# Altium footprint library controller_V1.3.1.PcbLib: 69 footprints (part 1 of 5)
Each footprint in its own frame and in the unit in brackets; x right, y up, seen from the top. Pads: shape width x height; smd on the part's side, far side on the other; paste and mask are expansions set on the pad; w line width, h text height; cw(c..) or ccw(c..) is an arc to the next point about the centre after c.
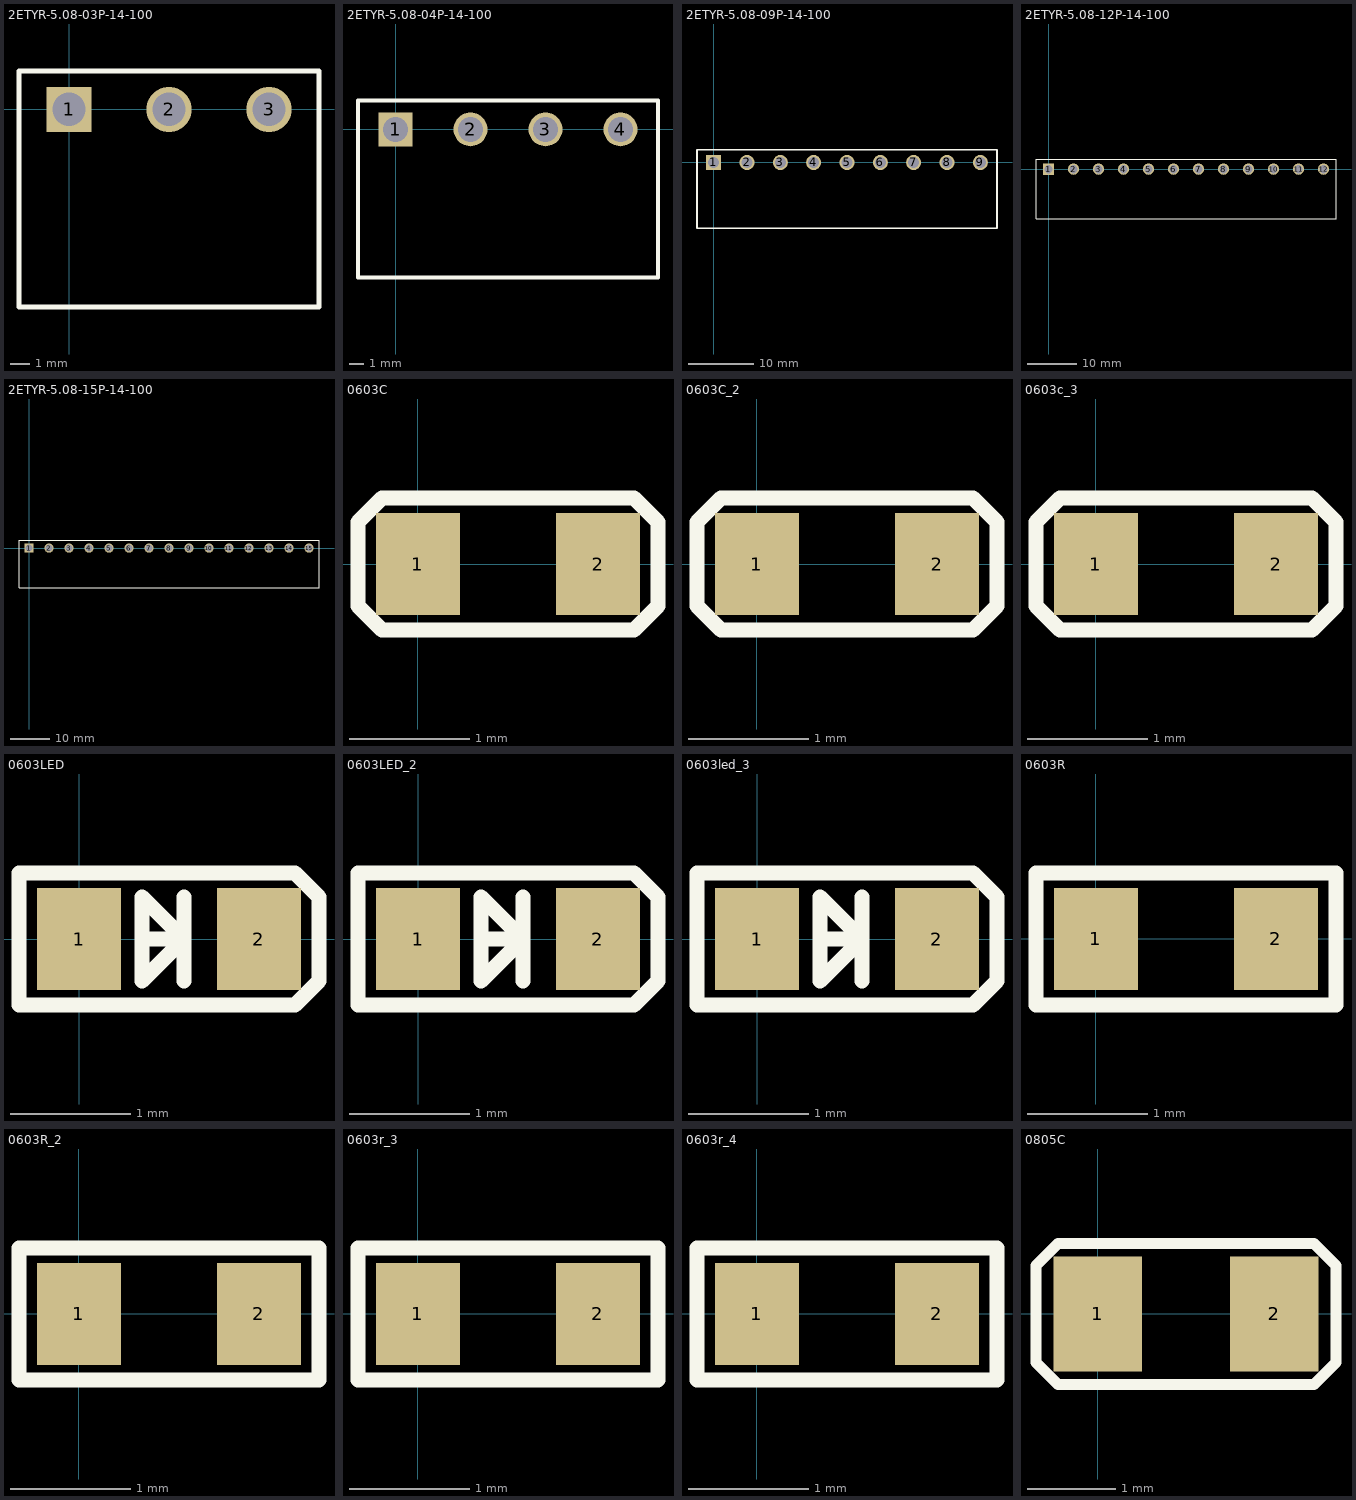
[diagram p0: the footprints below, top view; thin cyan lines are the x and y axes]

## 2ETYR-5.08-03P-14-100 [mm]
height 0.75
pads (3):
  rect 2.3x2.3 hole 1.7: 1(0,0)
  round 2.3 hole 1.7: 2(5.08,0) 3(10.16,0)
Top Overlay:
  lines w0.254: -2.54,-10.041 12.7,-10.041 12.7,1.959 -2.54,1.959 -2.54,-10.041
3D body "插座5.08-3p.STEP": height 8.57, standoff -3.5, extent -5.466,-10.033 15.594,1.967

## 2ETYR-5.08-04P-14-100 [mm]
height 0.75
pads (4):
  rect 2.3x2.3 hole 1.7: 1(0,0)
  round 2.3 hole 1.7: 2(5.08,0) 3(10.16,0) 4(15.24,0)
Top Overlay:
  lines w0.254: 2.54,-10.041 17.78,-10.041 17.78,1.959 2.54,1.959 ; 12.7,-10.041 -2.54,-10.041 -2.54,1.959 12.7,1.959
3D body "插座5.08-4p.STEP": height 8.57, standoff -3.5, extent -5.339,-10.033 20.801,1.967

## 2ETYR-5.08-09P-14-100 [mm]
height 0.75
pads (9):
  rect 2.3x2.3 hole 1.7: 1(0,0)
  round 2.3 hole 1.7: 2(5.08,0) 3(10.16,0) 4(15.24,0) 5(20.32,0) 6(25.4,0) 7(30.48,0) 8(35.56,0) 9(40.64,0)
Top Overlay:
  lines w0.254: 2.54,-10.041 17.78,-10.041 33.02,-10.041 ; 2.54,1.959 17.78,1.959 33.02,1.959 ; 7.62,-10.041 22.86,-10.041 38.1,-10.041 ; 7.62,1.959 22.86,1.959 38.1,1.959 ; 12.7,-10.041 27.94,-10.041 ; 12.7,-10.041 -2.54,-10.041 -2.54,1.959 12.7,1.959 ; 12.7,-10.041 27.94,-10.041 ; 12.7,1.959 27.94,1.959 ; 12.7,1.959 27.94,1.959 ; 27.94,-10.041 43.18,-10.041 43.18,1.959 27.94,1.959
3D body "插座5.08-9p.STEP": height 8.57, standoff -3.5, extent -5.339,-9.906 46.201,2.094

## 2ETYR-5.08-12P-14-100 [mm]
pads (12):
  rect 2.3x2.3 hole 1.7: 1(0,0)
  round 2.3 hole 1.7: 2(5.08,0) 3(10.16,0) 4(15.24,0) 5(20.32,0) 6(25.4,0) 7(30.48,0) 8(35.56,0) 9(40.64,0) 10(45.72,0) 11(50.8,0) 12(55.88,0)
Top Overlay:
  lines w0.254: 2.54,-10.041 17.78,-10.041 33.02,-10.041 48.26,-10.041 ; 2.54,1.959 17.78,1.959 33.02,1.959 48.26,1.959 ; 7.62,-10.041 22.86,-10.041 ; 7.62,1.959 22.86,1.959 ; 53.34,-10.041 38.1,-10.041 ; 53.34,1.959 38.1,1.959 ; 12.7,-10.041 27.94,-10.041 ; 12.7,-10.041 -2.54,-10.041 -2.54,1.959 12.7,1.959 ; 12.7,-10.041 27.94,-10.041 ; 12.7,1.959 27.94,1.959 ; 12.7,1.959 27.94,1.959 ; 22.86,-10.041 38.1,-10.041 ; 22.86,-10.041 38.1,-10.041 ; 22.86,1.959 38.1,1.959 ; 22.86,1.959 38.1,1.959 ; 27.94,-10.041 43.18,-10.041 ; 27.94,-10.041 43.18,-10.041 ; 27.94,-10.041 43.18,-10.041 ; 27.94,1.959 43.18,1.959 ; 27.94,1.959 43.18,1.959 ; 27.94,1.959 43.18,1.959 ; 43.18,-10.041 58.42,-10.041 58.42,1.959 43.18,1.959
3D body "插座5.08-12p.STEP": height 8.57, standoff -3.5, extent -5.45,-10.033 61.33,1.967

## 2ETYR-5.08-15P-14-100 [mm]
pads (15):
  rect 2.3x2.3 hole 1.7: 1(0,0)
  round 2.3 hole 1.7: 2(5.08,0) 3(10.16,0) 4(15.24,0) 5(20.32,0) 6(25.4,0) 7(30.48,0) 8(35.56,0) 9(40.64,0) 10(45.72,0) 11(50.8,0) 12(55.88,0) 13(60.96,0) 14(66.04,0) 15(71.12,0)
Top Overlay:
  lines w0.254: 2.54,-10.041 17.78,-10.041 33.02,-10.041 48.26,-10.041 ; 2.54,1.959 17.78,1.959 33.02,1.959 48.26,1.959 ; 7.62,-10.041 22.86,-10.041 ; 7.62,1.959 22.86,1.959 ; 68.58,-10.041 53.34,-10.041 38.1,-10.041 ; 68.58,1.959 53.34,1.959 38.1,1.959 ; 12.7,-10.041 27.94,-10.041 ; 12.7,-10.041 -2.54,-10.041 -2.54,1.959 12.7,1.959 ; 12.7,-10.041 27.94,-10.041 ; 12.7,1.959 27.94,1.959 ; 12.7,1.959 27.94,1.959 ; 22.86,-10.041 38.1,-10.041 ; 22.86,-10.041 38.1,-10.041 ; 22.86,1.959 38.1,1.959 ; 22.86,1.959 38.1,1.959 ; 27.94,-10.041 43.18,-10.041 ; 27.94,-10.041 43.18,-10.041 ; 27.94,-10.041 43.18,-10.041 ; 27.94,1.959 43.18,1.959 ; 27.94,1.959 43.18,1.959 ; 27.94,1.959 43.18,1.959 ; 43.18,-10.041 58.42,-10.041 73.66,-10.041 73.66,1.959 58.42,1.959 43.18,1.959
3D body "插座5.08-15p.STEP": height 8.57, standoff -3.5, extent -5.45,-9.968 76.57,2.032

## 0603C [mm]
height 0.75
pads (2):
  rect 0.7x0.85 smd: 1(0,0) 2(1.5,0)
Top Overlay:
  lines w0.127: -0.5,-0.35 -0.3,-0.55 1.8,-0.55 2,-0.35 2,0.35 1.8,0.55 -0.3,0.55 -0.5,0.35 -0.5,-0.35

## 0603C_2 [mm]
pads (2):
  rect 0.7x0.85 smd: 1(0,0) 2(1.5,0)
Top Overlay:
  lines w0.127: -0.5,-0.35 -0.3,-0.55 1.8,-0.55 2,-0.35 2,0.35 1.8,0.55 -0.3,0.55 -0.5,0.35 -0.5,-0.35

## 0603c_3 [mm]
pads (2):
  rect 0.7x0.85 smd: 1(0,0) 2(1.5,0)
Top Overlay:
  lines w0.127: -0.5,-0.35 -0.5,0.35 -0.3,0.55 1.8,0.55 2,0.35 2,-0.35 1.8,-0.55 -0.3,-0.55 -0.5,-0.35

## 0603LED [mm]
height 0.75
pads (2):
  rect 0.7x0.85 smd: 1(0,0) 2(1.5,0)
Top Overlay:
  lines w0.127: 0.525,0 0.875,0 ; 0.875,-0.35 0.875,0.35 ; 0.875,0 0.525,0.35 0.525,-0.35 0.875,0 ; -0.5,-0.55 -0.5,0.55 1.8,0.55 2,0.35 2,-0.35 1.8,-0.55 -0.5,-0.55
3D body "LED0603-RD_RED.STEP": height 0.61, standoff 0, extent -0.048,-0.4 1.572,0.41

## 0603LED_2 [mm]
pads (2):
  rect 0.7x0.85 smd: 1(0,0) 2(1.5,0)
Top Overlay:
  lines w0.127: 0.525,0 0.875,0 ; 0.875,-0.35 0.875,0.35 ; 0.875,0 0.525,-0.35 0.525,0.35 0.875,0 ; -0.5,-0.55 1.8,-0.55 2,-0.35 2,0.35 1.8,0.55 -0.5,0.55 -0.5,-0.55

## 0603led_3 [mm]
pads (2):
  rect 0.7x0.85 smd: 1(0,0) 2(1.5,0)
Top Overlay:
  lines w0.127: 0.525,0 0.875,0 ; 0.875,-0.35 0.875,0.35 ; 0.875,0 0.525,-0.35 0.525,0.35 0.875,0 ; -0.5,-0.55 1.8,-0.55 2,-0.35 2,0.35 1.8,0.55 -0.5,0.55 -0.5,-0.55

## 0603R [mm]
pads (2):
  rect 0.7x0.85 smd: 1(0,0) 2(1.5,0)
Top Overlay:
  lines w0.127: -0.5,-0.55 2,-0.55 2,0.55 -0.5,0.55 -0.5,-0.55

## 0603R_2 [mm]
pads (2):
  rect 0.7x0.85 smd: 1(0,0) 2(1.5,0)
Top Overlay:
  lines w0.127: -0.5,-0.55 -0.5,0.55 2,0.55 2,-0.55 -0.5,-0.55

## 0603r_3 [mm]
pads (2):
  rect 0.7x0.85 smd: 1(0,0) 2(1.5,0)
Top Overlay:
  lines w0.127: -0.5,-0.55 2,-0.55 2,0.55 -0.5,0.55 -0.5,-0.55

## 0603r_4 [mm]
pads (2):
  rect 0.7x0.85 smd: 1(0,0) 2(1.5,0)
Top Overlay:
  lines w0.127: -0.5,-0.55 2,-0.55 2,0.55 -0.5,0.55 -0.5,-0.55

## 0805C [mm]
pads (2):
  rect 1x1.3 smd: 1(0,0) 2(2,0)
Top Overlay:
  lines w0.127: 2.45,-0.8 2.7,-0.55 2.7,0.55 2.45,0.8 -0.45,0.8 -0.7,0.55 -0.7,-0.55 -0.45,-0.8 2.45,-0.8 ; 2.45,-0.8 2.45,-0.8